# Altium footprint library Integrated Chips.PcbLib: 46 footprints (part 1 of 3)
Each footprint in its own frame and in the unit in brackets; x right, y up, seen from the top. Pads: shape width x height; smd on the part's side, far side on the other; paste and mask are expansions set on the pad; w line width, h text height; cw(c..) or ccw(c..) is an arc to the next point about the centre after c.
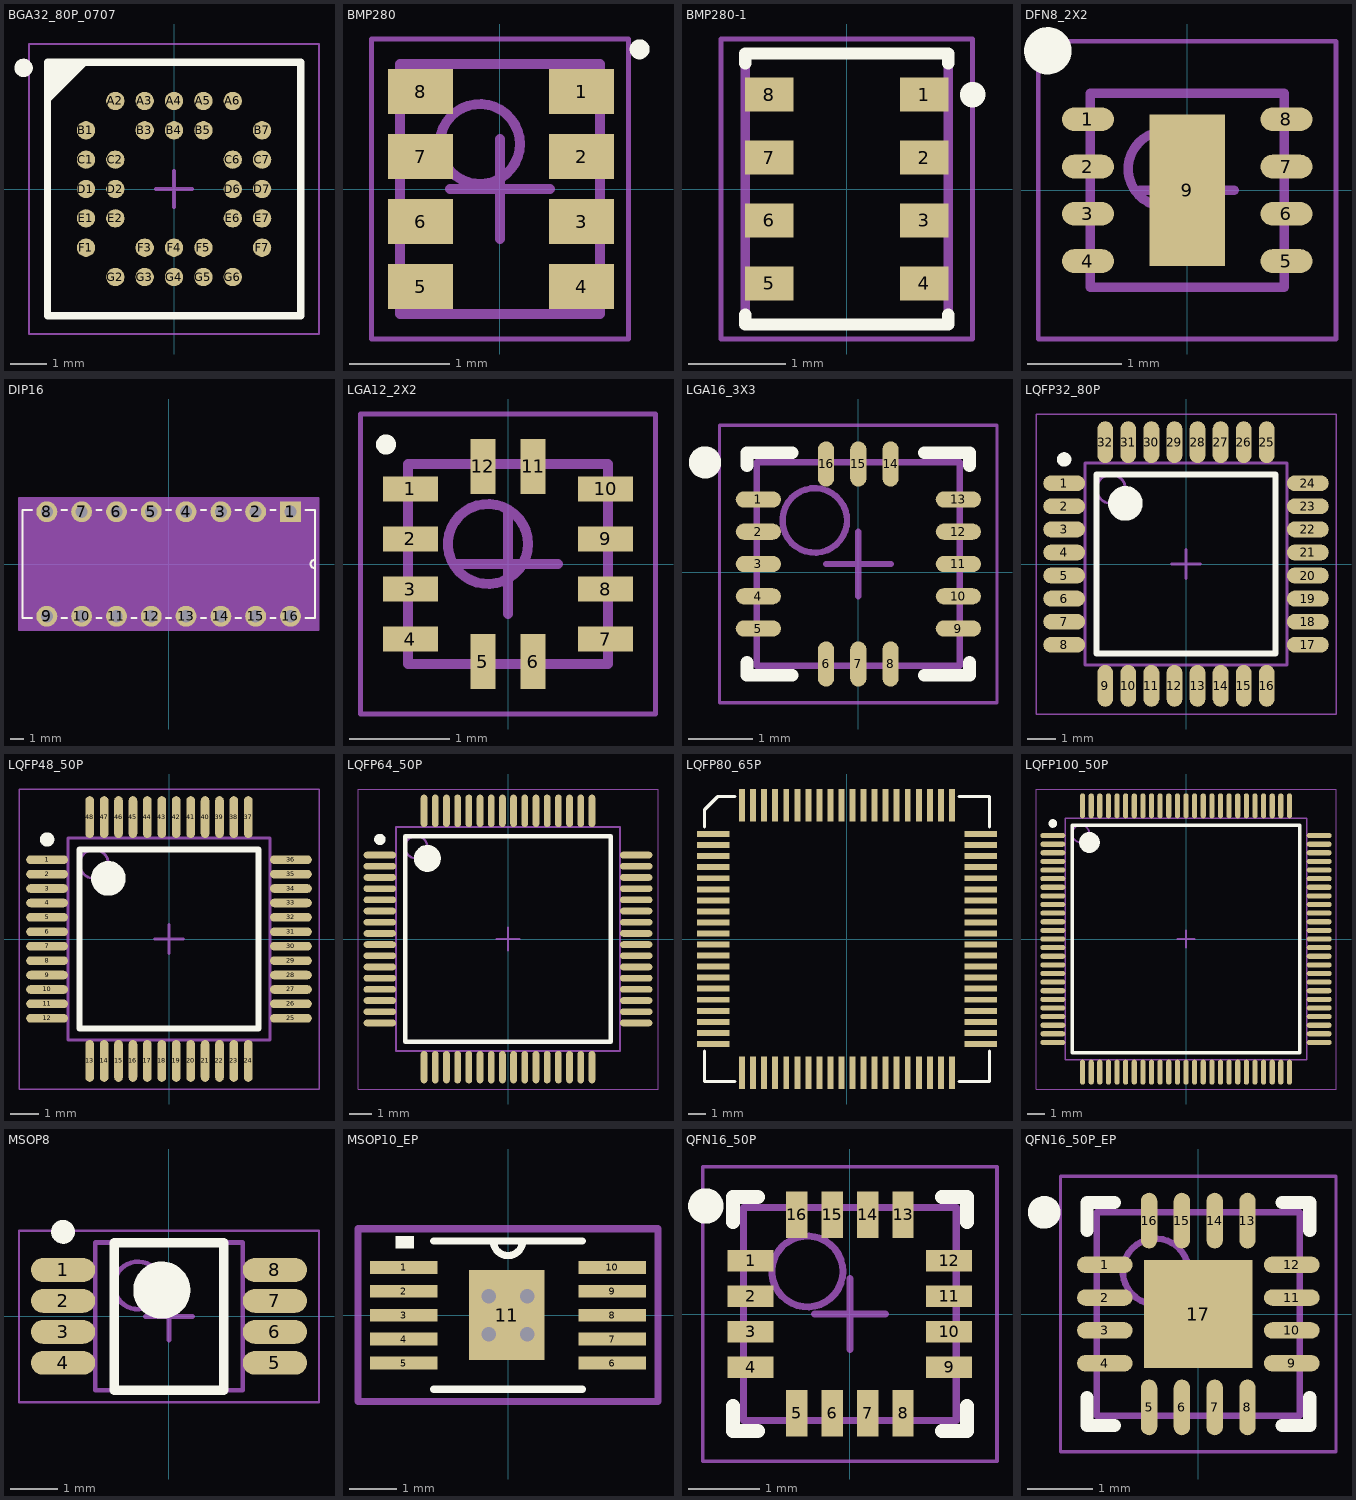
[diagram p0: the footprints below, top view; thin cyan lines are the x and y axes]

## BGA32_80P_0707 [mm]
pads (32):
  round 0.5 smd: A2(-1.6,2.4) A3(-0.8,2.4) A4(0,2.4) A5(0.8,2.4) A6(1.6,2.4) B1(-2.4,1.6) B3(-0.8,1.6) B4(0,1.6) B5(0.8,1.6) B7(2.4,1.6) C1(-2.4,0.8) C2(-1.6,0.8) C6(1.6,0.8) C7(2.4,0.8) D1(-2.4,0) D2(-1.6,0) D6(1.6,0) D7(2.4,0) E1(-2.4,-0.8) E2(-1.6,-0.8) E6(1.6,-0.8) E7(2.4,-0.8) F1(-2.4,-1.6) F3(-0.8,-1.6) F4(0,-1.6) F5(0.8,-1.6) F7(2.4,-1.6) G2(-1.6,-2.4) G3(-0.8,-2.4) G4(0,-2.4) G5(0.8,-2.4) G6(1.6,-2.4)
Top Overlay:
  circle w0.25: c-4.1,3.3 r0.125
  region: -2.45,3.45 -3.45,2.45 -3.45,3.45
  lines w0.2: -3.45,2.45 -2.45,3.45 ; -3.45,-3.45 3.45,-3.45 3.45,3.45 -3.45,3.45 -3.45,-3.45
Mechanical 13:
  lines w0.1: -3.44,-3.44 3.44,-3.44 3.44,3.44 -3.44,3.44 -3.44,-3.44
Mechanical 15:
  lines w0.05: -3.95,-3.95 3.95,-3.95 3.95,3.95 -3.95,3.95 -3.95,-3.95
  lines w0.1: -0.5,0 0.5,0 ; 0,-0.5 0,0.5
3D body "User Library-ADXRS620.STEP": height 3.81, standoff 0, extent -3.5,-3.5 3.5,3.5

## BMP280 [mm]
pads (8):
  rect 0.65x0.45 smd: 1(0.817,0.975) 2(0.817,0.325) 3(0.817,-0.325) 4(0.817,-0.975) 5(-0.792,-0.975) 6(-0.792,-0.325) 7(-0.792,0.325) 8(-0.792,0.975)
Top Overlay:
  circle w0.1: c1.397,1.397 r0.05
Mechanical 13:
  circle w0.1: c-0.2,0.45 r0.4
  lines w0.1: -1,-1.25 -1,1.25 1,1.25 1,-1.25 -1,-1.25
Mechanical 15:
  lines w0.05: -1.285,-1.5 -1.285,1.5 1.285,1.5 1.285,-1.5 -1.285,-1.5
  lines w0.1: -0.5,0 0.5,0 ; 0,-0.5 0,0.5
3D body "BMP280.STEP": height 1.13, standoff 0, extent -1,-1.23 1,1.27

## BMP280-1 [mm]
pads (8):
  rect 0.5x0.35 smd paste+0 mask+0.1: 1(0.8,0.975) 2(0.8,0.325) 3(0.8,-0.325) 4(0.8,-0.975) 5(-0.8,-0.975) 6(-0.8,-0.325) 7(-0.8,0.325) 8(-0.8,0.975)
Top Overlay:
  circle w0.254: c1.3,0.975 r0.005
  lines w0.127: -1.05,-1.3 -1.05,-1.4 1.05,-1.4 1.05,-1.3 ; -1.05,1.3 -1.05,1.4 1.05,1.4 1.05,1.3
Mechanical 13:
  lines w0.05: -1.05,0.96 -1.05,1.045 ; -1.05,1.215 -1.05,1.3
  lines w0.1: -1.05,-1.4 -1.05,1.4 1.05,1.4 1.05,-1.4 -1.05,-1.4
Mechanical 15:
  lines w0.05: -1.3,-1.55 -1.3,1.55 1.3,1.55 1.3,-1.55 -1.3,-1.55
3D body "BMP280.STEP": height 1.13, standoff 0, extent -1,-1.25 1,1.25

## DFN8_2X2 [mm] "QFN, 8-Leads, Body 2.00x2.00mm, Pitch 0.50mm, Thermal Pad 0.60x1.20mm, IPC Medium Density"
height 1
pads (9):
  oval 0.55x0.25 smd: 1(-1.05,0.75) 2(-1.05,0.25) 3(-1.05,-0.25) 4(-1.05,-0.75) 5(1.05,-0.75) 6(1.05,-0.25) 7(1.05,0.25) 8(1.05,0.75)
  rect 0.8x1.6 smd: 9(0,0)
Top Overlay:
  circle w0.25: c-1.475,1.475 r0.125
Mechanical 13:
  circle w0.1: c-0.225,0.225 r0.4
  lines w0.1: -1.025,-1.025 -1.025,1.025 1.025,1.025 1.025,-1.025 -1.025,-1.025
Mechanical 15:
  lines w0.05: -1.575,-1.575 -1.575,1.575 1.575,1.575 1.575,-1.575 -1.575,-1.575
  lines w0.1: -0.5,0 0.5,0 ; 0,-0.5 0,0.5
3D body "User Library-DFN 8(2x2).step": height 0.75, standoff -0.05, extent -1.001,-1 1.001,1

## DIP16 [mil]
pads (16):
  rect 60x60 / inner round 60 / far side rect 60x60 hole 35: 1(350,150)
  round 60 hole 35: 2(250,150) 3(150,150) 4(50,150) 5(-50,150) 6(-150,150) 7(-250,150) 8(-350,150) 9(-350,-150) 10(-250,-150) 11(-150,-150) 12(-50,-150) 13(50,-150) 14(150,-150) 15(250,-150) 16(350,-150)
Top Overlay:
  lines w6: -392.71,-155 -420,-155 -420,155 -392.71,155 ; -307.29,-155 -292.71,-155 ; -307.29,155 -292.71,155 ; -207.29,-155 -192.71,-155 ; -207.29,155 -192.71,155 ; -107.29,-155 -92.71,-155 ; -107.29,155 -92.71,155 ; -7.29,-155 7.29,-155 ; -7.29,155 7.29,155 ; 92.71,-155 107.29,-155 ; 92.71,155 107.29,155 ; 192.71,-155 207.29,-155 ; 192.71,155 207.29,155 ; 292.71,-155 307.29,-155 ; 292.71,155 307,155 ; 392.71,-155 420,-155 420,155 393,155 ; 420,-12 cw(c420,0) 420,12
Mechanical 13:
  lines w0: 420,-12 cw(c420,0) 420,12
Mechanical 15:
  region: -430,-190 -430,190 430,190 430,-190
  lines w6: -430,-190 -430,190 430,190 430,-190 -430,-190
3D body "User Library-DIP16-22mm.STEP": height 202.76, standoff -98.03, extent -432.68,-155.31 433.47,154.53

## LGA12_2X2 [mm]
pads (12):
  rect 0.55x0.25 smd: 1(-0.975,0.75) 2(-0.975,0.25) 3(-0.975,-0.25) 4(-0.975,-0.75) 7(0.975,-0.75) 8(0.975,-0.25) 9(0.975,0.25) 10(0.975,0.75)
  rect 0.25x0.55 smd: 5(-0.25,-0.975) 6(0.25,-0.975) 11(0.25,0.975) 12(-0.25,0.975)
Top Overlay:
  circle w0.1: c-1.219,1.194 r0.05
Mechanical 13:
  circle w0.1: c-0.2,0.2 r0.4
  lines w0.1: -1,-1 1,-1 1,1 -1,1 -1,-1
Mechanical 15:
  lines w0.05: -1.473,-1.499 1.473,-1.499 1.473,1.499 -1.473,1.499 -1.473,-1.499
  lines w0.1: -0.5,0 0.5,0 ; 0,-0.5 0,0.5
3D body "User Library-lga-2x2x0_9.step": height 0.95, standoff 0, extent -1,-1 1,1

## LGA16_3X3 [mm]
pads (16):
  oval 0.7x0.25 smd: 1(-1.55,1.127) 2(-1.55,0.627) 3(-1.55,0.127) 4(-1.55,-0.373) 5(-1.55,-0.873) 9(1.55,-0.873) 10(1.55,-0.373) 11(1.55,0.127) 12(1.55,0.627) 13(1.55,1.127)
  oval 0.25x0.7 smd: 6(-0.5,-1.423) 7(0,-1.423) 8(0.5,-1.423) 14(0.5,1.677) 15(0,1.677) 16(-0.5,1.677)
Top Overlay:
  circle w0.25: c-2.375,1.702 r0.125
  lines w0.2: -1.725,-1.398 -1.725,-1.598 -1.025,-1.598 ; -1.725,1.652 -1.725,1.852 -1.025,1.852 ; 1.025,-1.598 1.725,-1.598 1.725,-1.398 ; 1.025,1.852 1.725,1.852 1.725,1.652
Mechanical 13:
  circle w0.1: c-0.675,0.802 r0.5
  lines w0.1: -1.575,-1.448 1.575,-1.448 1.575,1.702 -1.575,1.702 -1.575,-1.448
Mechanical 15:
  lines w0.05: -2.15,-2.023 2.15,-2.023 2.15,2.277 -2.15,2.277 -2.15,-2.023
  lines w0.1: -0.5,0.127 0.5,0.127 ; 0,-0.373 0,0.627
3D body "User Library-LIS331AL.step": height 1.01, standoff -0.01, extent -1.5,-1.37 1.5,1.63

## LQFP32_80P [mm] "TQFP, 32-Leads, Body 7.00x7.00mm, Pitch 0.80mm, IPC Medium Density"
height 1.6
pads (32):
  oval 1.45x0.55 smd: 1(-4.225,2.8) 2(-4.225,2) 3(-4.225,1.2) 4(-4.225,0.4) 5(-4.225,-0.4) 6(-4.225,-1.2) 7(-4.225,-2) 8(-4.225,-2.8) 17(4.225,-2.8) 18(4.225,-2) 19(4.225,-1.2) 20(4.225,-0.4) 21(4.225,0.4) 22(4.225,1.2) 23(4.225,2) 24(4.225,2.8)
  oval 0.55x1.45 smd: 9(-2.8,-4.225) 10(-2,-4.225) 11(-1.2,-4.225) 12(-0.4,-4.225) 13(0.4,-4.225) 14(1.2,-4.225) 15(2,-4.225) 16(2.8,-4.225) 25(2.8,4.225) 26(2,4.225) 27(1.2,4.225) 28(0.4,4.225) 29(-0.4,4.225) 30(-1.2,4.225) 31(-2,4.225) 32(-2.8,4.225)
Top Overlay:
  circle w0.6: c-2.1,2.1 r0.3
  circle w0.25: c-4.225,3.625 r0.125
  lines w0.2: -3.1,-3.1 3.1,-3.1 3.1,3.1 -3.1,3.1 -3.1,-3.1
Mechanical 13:
  circle w0.1: c-2.6,2.6 r0.5
  lines w0.1: -3.5,-3.5 3.5,-3.5 3.5,3.5 -3.5,3.5 -3.5,-3.5
Mechanical 15:
  lines w0.05: -5.2,-5.2 5.2,-5.2 5.2,5.2 -5.2,5.2 -5.2,-5.2
  lines w0.1: -0.5,0 0.5,0 ; 0,-0.5 0,0.5
3D body "User Library-LQFP32-2.STEP": height 1.62, standoff -0.01, extent -4.571,-4.572 4.572,4.572

## LQFP48_50P [mm] "TSQFP, 48-Leads, Body 7.00x7.00mm, Pitch 0.50mm, IPC Medium Density"
height 1.6
pads (48):
  oval 1.45x0.3 smd: 1(-4.225,2.75) 2(-4.225,2.25) 3(-4.225,1.75) 4(-4.225,1.25) 5(-4.225,0.75) 6(-4.225,0.25) 7(-4.225,-0.25) 8(-4.225,-0.75) 9(-4.225,-1.25) 10(-4.225,-1.75) 11(-4.225,-2.25) 12(-4.225,-2.75) 25(4.225,-2.75) 26(4.225,-2.25) 27(4.225,-1.75) 28(4.225,-1.25) 29(4.225,-0.75) 30(4.225,-0.25) 31(4.225,0.25) 32(4.225,0.75) 33(4.225,1.25) 34(4.225,1.75) 35(4.225,2.25) 36(4.225,2.75)
  oval 0.3x1.45 smd: 13(-2.75,-4.225) 14(-2.25,-4.225) 15(-1.75,-4.225) 16(-1.25,-4.225) 17(-0.75,-4.225) 18(-0.25,-4.225) 19(0.25,-4.225) 20(0.75,-4.225) 21(1.25,-4.225) 22(1.75,-4.225) 23(2.25,-4.225) 24(2.75,-4.225) 37(2.75,4.225) 38(2.25,4.225) 39(1.75,4.225) 40(1.25,4.225) 41(0.75,4.225) 42(0.25,4.225) 43(-0.25,4.225) 44(-0.75,4.225) 45(-1.25,4.225) 46(-1.75,4.225) 47(-2.25,4.225) 48(-2.75,4.225)
Top Overlay:
  circle w0.25: c-4.225,3.45 r0.125
  circle w0.6: c-2.1,2.1 r0.3
  lines w0.2: -3.1,-3.1 -3.1,3.1 3.1,3.1 3.1,-3.1 -3.1,-3.1
Mechanical 13:
  circle w0.1: c-2.6,2.6 r0.5
  lines w0.1: -3.5,-3.5 -3.5,3.5 3.5,3.5 3.5,-3.5 -3.5,-3.5
Mechanical 15:
  lines w0.05: -5.2,-5.2 -5.2,5.2 5.2,5.2 5.2,-5.2 -5.2,-5.2
  lines w0.1: -0.5,0 0.5,0 ; 0,-0.5 0,0.5
3D body "User Library-LQFP48-2.STEP": height 1.62, standoff -0.01, extent -4.572,-4.572 4.572,4.572

## LQFP64_50P [mm] "TSQFP, 64-Leads, Body 10.00x10.00mm, Pitch 0.50mm, IPC Medium Density"
height 1.6
pads (64):
  oval 1.45x0.3 smd: 1(-5.725,3.75) 2(-5.725,3.25) 3(-5.725,2.75) 4(-5.725,2.25) 5(-5.725,1.75) 6(-5.725,1.25) 7(-5.725,0.75) 8(-5.725,0.25) 9(-5.725,-0.25) 10(-5.725,-0.75) 11(-5.725,-1.25) 12(-5.725,-1.75) 13(-5.725,-2.25) 14(-5.725,-2.75) 15(-5.725,-3.25) 16(-5.725,-3.75) 33(5.725,-3.75) 34(5.725,-3.25) 35(5.725,-2.75) 36(5.725,-2.25) 37(5.725,-1.75) 38(5.725,-1.25) 39(5.725,-0.75) 40(5.725,-0.25) 41(5.725,0.25) 42(5.725,0.75) 43(5.725,1.25) 44(5.725,1.75) 45(5.725,2.25) 46(5.725,2.75) 47(5.725,3.25) 48(5.725,3.75)
  oval 0.3x1.45 smd: 17(-3.75,-5.725) 18(-3.25,-5.725) 19(-2.75,-5.725) 20(-2.25,-5.725) 21(-1.75,-5.725) 22(-1.25,-5.725) 23(-0.75,-5.725) 24(-0.25,-5.725) 25(0.25,-5.725) 26(0.75,-5.725) 27(1.25,-5.725) 28(1.75,-5.725) 29(2.25,-5.725) 30(2.75,-5.725) 31(3.25,-5.725) 32(3.75,-5.725) 49(3.75,5.725) 50(3.25,5.725) 51(2.75,5.725) 52(2.25,5.725) 53(1.75,5.725) 54(1.25,5.725) 55(0.75,5.725) 56(0.25,5.725) 57(-0.25,5.725) 58(-0.75,5.725) 59(-1.25,5.725) 60(-1.75,5.725) 61(-2.25,5.725) 62(-2.75,5.725) 63(-3.25,5.725) 64(-3.75,5.725)
Top Overlay:
  circle w0.25: c-5.725,4.45 r0.125
  circle w0.6: c-3.6,3.6 r0.3
  lines w0.2: -4.6,-4.6 -4.6,4.6 4.6,4.6 4.6,-4.6 -4.6,-4.6
Mechanical 13:
  circle w0.1: c-4.1,4.1 r0.5
  lines w0.1: -5,-5 -5,5 5,5 5,-5 -5,-5
Mechanical 15:
  lines w0.05: -6.7,-6.7 -6.7,6.7 6.7,6.7 6.7,-6.7 -6.7,-6.7
  lines w0.1: -0.5,0 0.5,0 ; 0,-0.5 0,0.5
3D body "User Library-LQFP64-2.STEP": height 1.62, standoff -0.01, extent -6.071,-6.072 6.072,6.072

## LQFP80_65P [mm] "LQFP, 80-Leads, Body 14.00x14.00mm, Pitch 0.65mm, IPC Medium Density"
pads (80):
  rect 1.9x0.35 smd: 1(-7.875,6.175) 2(-7.875,5.525) 3(-7.875,4.875) 4(-7.875,4.225) 5(-7.875,3.575) 6(-7.875,2.925) 7(-7.875,2.275) 8(-7.875,1.625) 9(-7.875,0.975) 10(-7.875,0.325) 11(-7.875,-0.325) 12(-7.875,-0.975) 13(-7.875,-1.625) 14(-7.875,-2.275) 15(-7.875,-2.925) 16(-7.875,-3.575) 17(-7.875,-4.225) 18(-7.875,-4.875) 19(-7.875,-5.525) 20(-7.875,-6.175) 41(7.875,-6.175) 42(7.875,-5.525) 43(7.875,-4.875) 44(7.875,-4.225) 45(7.875,-3.575) 46(7.875,-2.925) 47(7.875,-2.275) 48(7.875,-1.625) 49(7.875,-0.975) 50(7.875,-0.325) 51(7.875,0.325) 52(7.875,0.975) 53(7.875,1.625) 54(7.875,2.275) 55(7.875,2.925) 56(7.875,3.575) 57(7.875,4.225) 58(7.875,4.875) 59(7.875,5.525) 60(7.875,6.175)
  rect 0.35x1.9 smd: 21(-6.175,-7.875) 22(-5.525,-7.875) 23(-4.875,-7.875) 24(-4.225,-7.875) 25(-3.575,-7.875) 26(-2.925,-7.875) 27(-2.275,-7.875) 28(-1.625,-7.875) 29(-0.975,-7.875) 30(-0.325,-7.875) 31(0.325,-7.875) 32(0.975,-7.875) 33(1.625,-7.875) 34(2.275,-7.875) 35(2.925,-7.875) 36(3.575,-7.875) 37(4.225,-7.875) 38(4.875,-7.875) 39(5.525,-7.875) 40(6.175,-7.875) 61(6.175,7.875) 62(5.525,7.875) 63(4.875,7.875) 64(4.225,7.875) 65(3.575,7.875) 66(2.925,7.875) 67(2.275,7.875) 68(1.625,7.875) 69(0.975,7.875) 70(0.325,7.875) 71(-0.325,7.875) 72(-0.975,7.875) 73(-1.625,7.875) 74(-2.275,7.875) 75(-2.925,7.875) 76(-3.575,7.875) 77(-4.225,7.875) 78(-4.875,7.875) 79(-5.525,7.875) 80(-6.175,7.875)
Top Overlay:
  lines w0.2: -8.382,-6.604 -8.382,-8.382 -6.604,-8.382 ; -8.382,6.604 -8.382,7.62 -7.62,8.382 -6.604,8.382 ; 6.604,-8.382 8.382,-8.382 8.382,-6.604 ; 6.604,8.382 8.382,8.382 8.382,6.604
3D body "SW3dPS-LQFP-80 14x14.STEP": height 1.55, standoff -0.04, extent -8.005,-8.005 8.005,8.005

## LQFP100_50P [mm] "TSQFP, 100-Leads, Body 14.00x14.00mm, Pitch 0.50mm, IPC Medium Density"
height 1.6
pads (100):
  oval 1.45x0.3 smd: 1(-7.725,6) 2(-7.725,5.5) 3(-7.725,5) 4(-7.725,4.5) 5(-7.725,4) 6(-7.725,3.5) 7(-7.725,3) 8(-7.725,2.5) 9(-7.725,2) 10(-7.725,1.5) 11(-7.725,1) 12(-7.725,0.5) 13(-7.725,0) 14(-7.725,-0.5) 15(-7.725,-1) 16(-7.725,-1.5) 17(-7.725,-2) 18(-7.725,-2.5) 19(-7.725,-3) 20(-7.725,-3.5) 21(-7.725,-4) 22(-7.725,-4.5) 23(-7.725,-5) 24(-7.725,-5.5) 25(-7.725,-6) 51(7.725,-6) 52(7.725,-5.5) 53(7.725,-5) 54(7.725,-4.5) 55(7.725,-4) 56(7.725,-3.5) 57(7.725,-3) 58(7.725,-2.5) 59(7.725,-2) 60(7.725,-1.5) 61(7.725,-1) 62(7.725,-0.5) 63(7.725,0) 64(7.725,0.5) 65(7.725,1) 66(7.725,1.5) 67(7.725,2) 68(7.725,2.5) 69(7.725,3) 70(7.725,3.5) 71(7.725,4) 72(7.725,4.5) 73(7.725,5) 74(7.725,5.5) 75(7.725,6)
  oval 0.3x1.45 smd: 26(-6,-7.725) 27(-5.5,-7.725) 28(-5,-7.725) 29(-4.5,-7.725) 30(-4,-7.725) 31(-3.5,-7.725) 32(-3,-7.725) 33(-2.5,-7.725) 34(-2,-7.725) 35(-1.5,-7.725) 36(-1,-7.725) 37(-0.5,-7.725) 38(0,-7.725) 39(0.5,-7.725) 40(1,-7.725) 41(1.5,-7.725) 42(2,-7.725) 43(2.5,-7.725) 44(3,-7.725) 45(3.5,-7.725) 46(4,-7.725) 47(4.5,-7.725) 48(5,-7.725) 49(5.5,-7.725) 50(6,-7.725) 76(6,7.725) 77(5.5,7.725) 78(5,7.725) 79(4.5,7.725) 80(4,7.725) 81(3.5,7.725) 82(3,7.725) 83(2.5,7.725) 84(2,7.725) 85(1.5,7.725) 86(1,7.725) 87(0.5,7.725) 88(0,7.725) 89(-0.5,7.725) 90(-1,7.725) 91(-1.5,7.725) 92(-2,7.725) 93(-2.5,7.725) 94(-3,7.725) 95(-3.5,7.725) 96(-4,7.725) 97(-4.5,7.725) 98(-5,7.725) 99(-5.5,7.725) 100(-6,7.725)
Top Overlay:
  circle w0.25: c-7.725,6.7 r0.125
  circle w0.6: c-5.6,5.6 r0.3
  lines w0.2: -6.6,-6.6 -6.6,6.6 6.6,6.6 6.6,-6.6 -6.6,-6.6
Mechanical 13:
  circle w0.1: c-6.1,6.1 r0.5
  lines w0.1: -7,-7 -7,7 7,7 7,-7 -7,-7
Mechanical 15:
  lines w0.05: -8.7,-8.7 -8.7,8.7 8.7,8.7 8.7,-8.7 -8.7,-8.7
  lines w0.1: -0.5,0 0.5,0 ; 0,-0.5 0,0.5
3D body "User Library-LQFP100-3.STEP": height 1.62, standoff -0.01, extent -8.072,-8.072 8.072,8.072

## MSOP8 [mm] "TSOP, 8-Leads, Body 3.00x3.00mm, Pitch 0.65mm, IPC Medium Density"
height 1.1
pads (8):
  oval 1.35x0.5 smd: 1(-2.225,0.975) 2(-2.225,0.325) 3(-2.225,-0.325) 4(-2.225,-0.975) 5(2.225,-0.975) 6(2.225,-0.325) 7(2.225,0.325) 8(2.225,0.975)
Top Overlay:
  circle w0.6: c-0.15,0.55 r0.3
  circle w0.25: c-2.225,1.775 r0.125
  lines w0.2: -1.15,-1.55 1.15,-1.55 1.15,1.55 -1.15,1.55 -1.15,-1.55
Mechanical 13:
  circle w0.1: c-0.65,0.65 r0.5
  lines w0.1: -1.55,-1.55 1.55,-1.55 1.55,1.55 -1.55,1.55 -1.55,-1.55
Mechanical 15:
  lines w0.05: -3.15,-1.8 3.15,-1.8 3.15,1.8 -3.15,1.8 -3.15,-1.8
  lines w0.1: -0.5,0 0.5,0 ; 0,-0.5 0,0.5
3D body "User Library-msop-8.step": height 1.15, standoff 0, extent -2.45,-1.5 2.45,1.5

## MSOP10_EP [mm]
pads (11):
  rect 1.411x0.27 smd: 1(-2.175,1) 2(-2.175,0.5) 3(-2.175,0) 4(-2.175,-0.5) 5(-2.175,-1) 6(2.175,-1) 7(2.175,-0.5) 8(2.175,0) 9(2.175,0.5) 10(2.175,1)
  rect 1.57x1.88 smd: 11(-0.025,0)
via 0.4,-0.4 diameter 0.5 hole 0.3
via -0.4,-0.4 diameter 0.5 hole 0.3
via 0.4,0.4 diameter 0.5 hole 0.3
via -0.4,0.4 diameter 0.5 hole 0.3
Top Overlay:
  region: -2.349,1.397 -2.349,1.651 -1.968,1.651 -1.968,1.397
  lines w0.152: -1.55,-1.55 1.55,-1.55 ; -1.55,1.55 1.55,1.55 ; -0.305,1.55 ccw(c0,1.55) 0.305,1.55
Mechanical 13:
  lines w0: -0.305,1.55 ccw(c0,1.55) 0.305,1.55
Mechanical 15:
  lines w0.152: -3.135,-1.804 3.135,-1.804 3.135,1.804 -3.135,1.804 -3.135,-1.804
3D body "DGQ10_1P88X1P57.stp": height 1.7, standoff 0, extent -2.525,-1.55 2.525,1.55

## QFN16_50P [mm]
pads (16):
  rect 0.65x0.3 smd: 1(-1.4,0.75) 2(-1.4,0.25) 3(-1.4,-0.25) 4(-1.4,-0.75) 9(1.4,-0.75) 10(1.4,-0.25) 11(1.4,0.25) 12(1.4,0.75)
  rect 0.3x0.65 smd: 5(-0.75,-1.4) 6(-0.25,-1.4) 7(0.25,-1.4) 8(0.75,-1.4) 13(0.75,1.4) 14(0.25,1.4) 15(-0.25,1.4) 16(-0.75,1.4)
Top Overlay:
  circle w0.25: c-2.032,1.524 r0.125
  lines w0.2: -1.65,-1.3 -1.65,-1.65 -1.3,-1.65 ; -1.65,1.3 -1.65,1.65 -1.3,1.65 ; 1.3,-1.65 1.65,-1.65 1.65,-1.3 ; 1.3,1.65 1.65,1.65 1.65,1.3
Mechanical 13:
  circle w0.1: c-0.6,0.6 r0.5
  lines w0.1: -1.5,-1.5 -1.5,1.5 1.5,1.5 1.5,-1.5 -1.5,-1.5
Mechanical 15:
  lines w0.05: -2.075,-2.075 -2.075,2.075 2.075,2.075 2.075,-2.075 -2.075,-2.075
  lines w0.1: -0.5,0 0.5,0 ; 0,-0.5 0,0.5
3D body "QFN-16 (3x3).stp": height 0.81, standoff -0.05, extent -1.5,-1.5 1.5,1.5

## QFN16_50P_EP [mm] "QFN, 16-Leads, Body 3.00x3.00mm, Pitch 0.50mm, Thermal Pad 1.65x1.65mm, IPC Medium Density"
height 1
pads (17):
  oval 0.85x0.25 smd: 1(-1.425,0.75) 2(-1.425,0.25) 3(-1.425,-0.25) 4(-1.425,-0.75) 9(1.425,-0.75) 10(1.425,-0.25) 11(1.425,0.25) 12(1.425,0.75)
  oval 0.25x0.85 smd: 5(-0.75,-1.425) 6(-0.25,-1.425) 7(0.25,-1.425) 8(0.75,-1.425) 13(0.75,1.425) 14(0.25,1.425) 15(-0.25,1.425) 16(-0.75,1.425)
  rect 1.65x1.65 smd: 17(0,0)
Top Overlay:
  circle w0.25: c-2.35,1.55 r0.125
  lines w0.2: -1.7,-1.275 -1.7,-1.7 -1.275,-1.7 ; -1.7,1.275 -1.7,1.7 -1.275,1.7 ; 1.275,-1.7 1.7,-1.7 1.7,-1.275 ; 1.275,1.7 1.7,1.7 1.7,1.275
Mechanical 13:
  circle w0.1: c-0.65,0.65 r0.5
  lines w0.1: -1.55,-1.55 1.55,-1.55 1.55,1.55 -1.55,1.55 -1.55,-1.55
Mechanical 15:
  lines w0.05: -2.1,-2.1 2.1,-2.1 2.1,2.1 -2.1,2.1 -2.1,-2.1
  lines w0.1: -0.5,0 0.5,0 ; 0,-0.5 0,0.5
3D body "QFN-16 (3x3).stp": height 0.81, standoff -0.05, extent -1.5,-1.5 1.5,1.5